# Altium footprint library iMag.PcbLib: 77 footprints (part 4 of 5)
Each footprint in its own frame and in the unit in brackets; x right, y up, seen from the top. Pads: shape width x height; smd on the part's side, far side on the other; paste and mask are expansions set on the pad; w line width, h text height; cw(c..) or ccw(c..) is an arc to the next point about the centre after c.
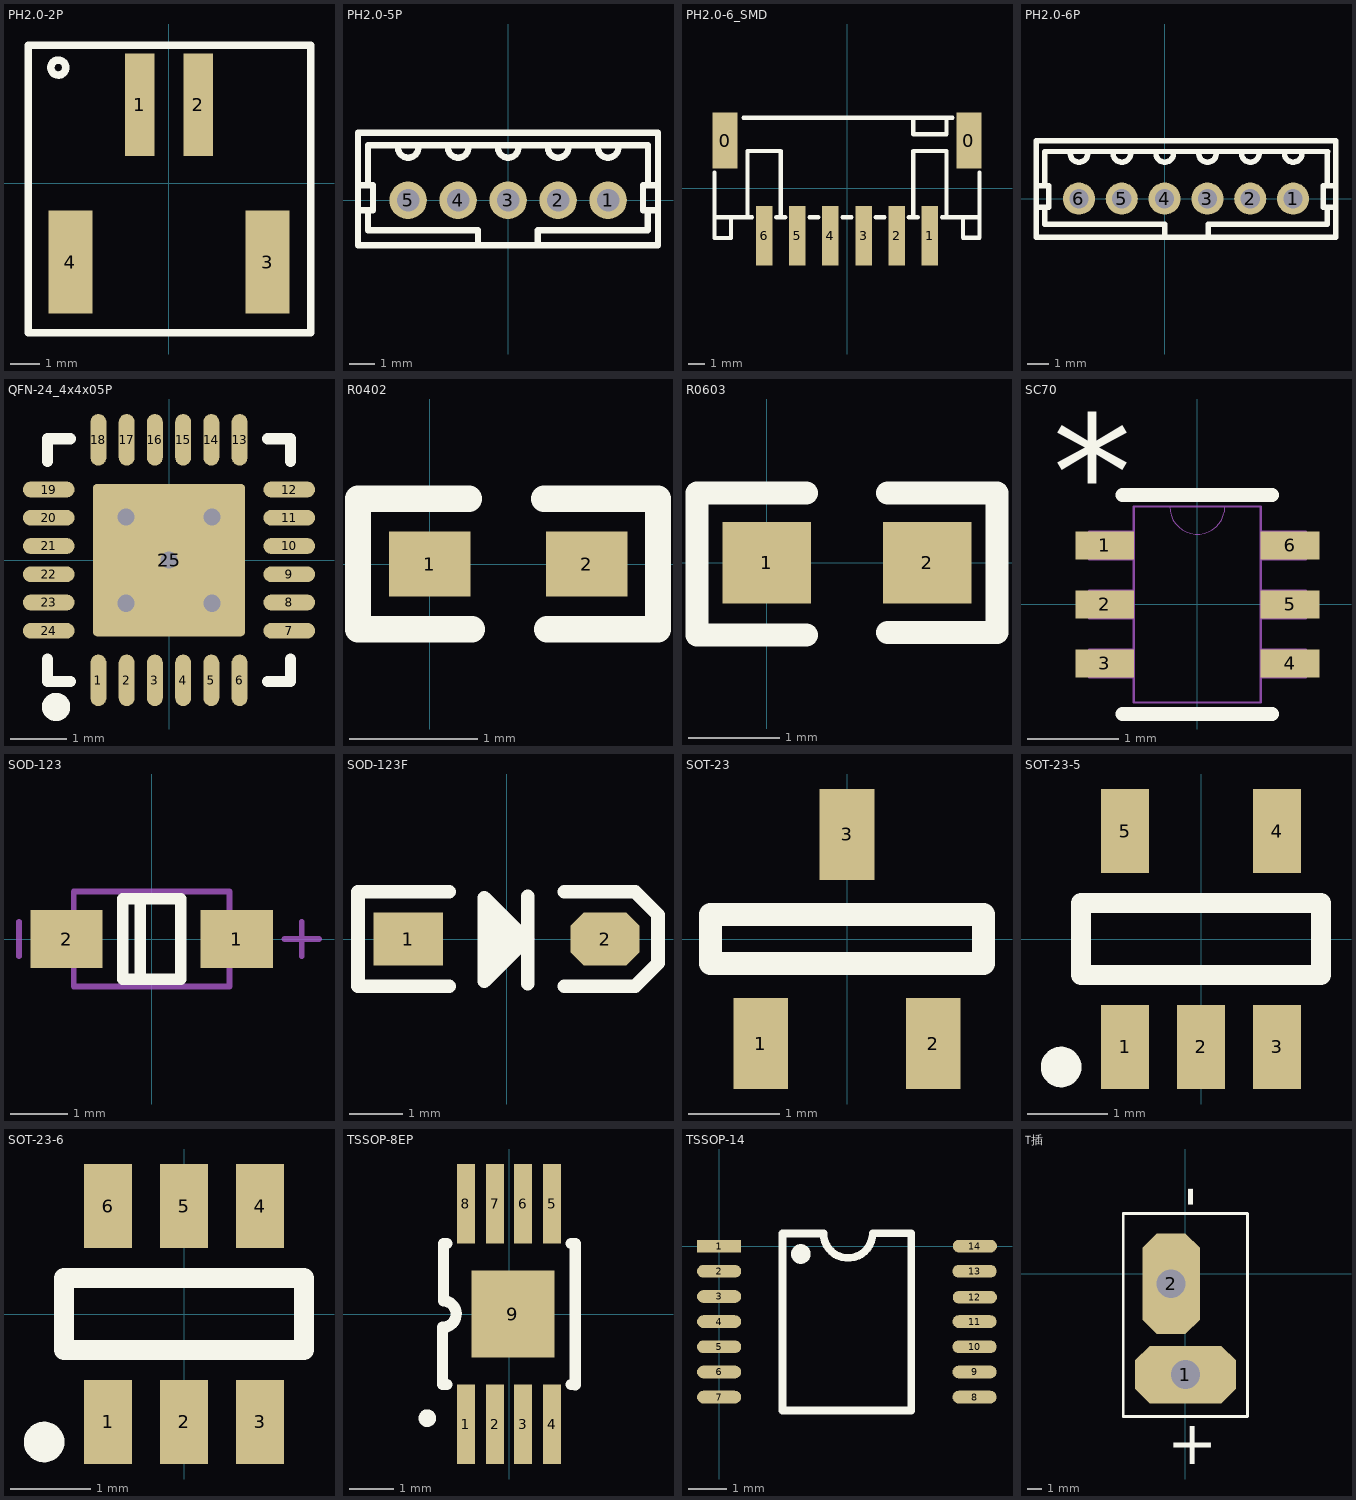
[diagram p3: the footprints below, top view; thin cyan lines are the x and y axes]

## PH2.0-2P [mm] "CONN-SMD_2P-P2.00_A2001WR-S-2P"
height 10.16
pads (4):
  rect 1x3.5 smd: 1(-1,2.675) 2(1,2.675)
  rect 1.5x3.5 smd: 3(3.35,-2.675) 4(-3.35,-2.675)
Top Overlay:
  circle w0.254: c-3.764,3.937 r0.254
  lines w0.254: -4.78,-5.08 4.826,-5.08 4.826,4.699 -4.78,4.699 -4.78,-5.08
3D body "User Library-PH2_0-2P.X_T": height 6.76, standoff 0.06, extent -3,-3.556 3,4.394

## PH2.0-5P [mm]
pads (5):
  round 1.5 hole 0.9: 1(4,0) 2(2,0) 3(0,0) 4(-2,0) 5(-4,0)
Top Overlay:
  lines w0.254: -6.002,-0.399 -5.402,-0.399 -5.402,0.601 -6.002,0.601 ; -5.601,-0.398 -5.601,-1.198 -1.201,-1.198 -1.201,-1.798 ; -5.6,0.6 -5.601,0.599 -5.601,2.202 5.598,2.202 5.598,0.602 ; -4.394,2.203 ccw(c-3.994,2.113) -3.594,2.203 ; -2.393,2.203 ccw(c-1.993,2.113) -1.593,2.203 ; -0.393,2.203 ccw(c0.007,2.113) 0.407,2.203 ; 1.196,-1.796 1.196,-1.196 5.596,-1.196 5.596,-0.396 ; 1.605,2.203 ccw(c2.005,2.113) 2.405,2.203 ; 3.605,2.203 ccw(c4.005,2.113) 4.405,2.203 ; 5.998,-1.798 5.998,2.702 ; 5.998,-0.398 5.398,-0.398 5.398,0.602 5.998,0.602 ; 6,-1.799 -6,-1.799 -6,2.702 6,2.702
3D body "User Library-PH2_0-5P.X_T": height 6, standoff -3.44, extent -6,-1.651 6,3.149

## PH2.0-6_SMD [mm]
pads (8):
  rect 1.5x3.4 smd: 0(-7.35,2.875) 0(7.35,2.875)
  rect 1x3.6 smd: 1(5,-2.875) 2(3,-2.875) 3(1,-2.875) 4(-1,-2.875) 5(-3.001,-2.871) 6(-5,-2.874)
Top Overlay:
  lines w0.254: -8.001,-1.75 -8.001,0.944 ; -7,-1.75 -7,-3 -8,-3 -8,-1.75 -5.731,-1.75 ; -6.25,4.25 6.369,4.25 ; -6,-1.75 -6,2.25 -4,2.25 -4,-1.75 ; -4.269,-1.75 -3.732,-1.75 ; -2.27,-1.75 -1.731,-1.75 ; -0.269,-1.75 0.269,-1.75 ; 1.731,-1.75 2.269,-1.75 ; 3.731,-1.75 4.269,-1.75 ; 4,-1.75 4,2.25 6,2.25 6,-1.75 ; 4,4.25 4,3.25 6,3.25 6,4.25 ; 5.731,-1.75 7.999,-1.75 ; 6.999,-1.747 6.999,-2.998 7.999,-2.998 7.999,-1.747 7.999,0.944

## PH2.0-6P [mm]
pads (6):
  round 1.5 hole 0.9: 1(6,0) 2(4,0) 3(2,0) 4(0,0) 5(-2,0) 6(-4,0)
Top Overlay:
  lines w0.254: -6.002,-0.399 -5.402,-0.399 -5.402,0.601 -6.002,0.601 ; -5.601,-0.398 -5.601,-1.198 0,-1.198 0,-1.798 ; -5.6,0.6 -5.601,0.599 -5.601,2.202 7.62,2.202 ; -4.394,2.203 ccw(c-3.994,2.113) -3.594,2.203 ; -2.393,2.203 ccw(c-1.993,2.113) -1.593,2.203 ; -0.393,2.203 ccw(c0.007,2.113) 0.407,2.203 ; 1.605,2.203 ccw(c2.005,2.113) 2.405,2.203 ; 2.032,-1.796 2.032,-1.196 5.596,-1.196 7.598,-1.196 ; 3.605,2.203 ccw(c4.005,2.113) 4.405,2.203 ; 5.605,2.203 ccw(c6.005,2.113) 6.405,2.203 ; 7.601,-1.198 7.601,-0.398 ; 7.601,0.599 7.601,2.202 ; 8,-1.798 8,2.702 6,2.702 -6,2.702 -6,-1.798 8.001,-1.799 ; 8.002,-0.399 7.402,-0.399 7.402,0.601 8.002,0.601
3D body "User Library-PH2_0-6P-1.X_T": height 4.8, standoff -3.15, extent -5.984,-6.477 8.016,0.223

## QFN-24_4x4x05P [mm]
height 1
pads (25):
  oval 0.28x0.914 smd mask+0.051: 1(-1.25,-2.13) 2(-0.75,-2.13) 3(-0.25,-2.13) 4(0.25,-2.13) 5(0.75,-2.13) 6(1.25,-2.13) 13(1.25,2.13) 14(0.75,2.13) 15(0.25,2.13) 16(-0.25,2.13) 17(-0.75,2.13) 18(-1.25,2.13)
  oval 0.914x0.28 smd mask+0.051: 7(2.13,-1.25) 8(2.13,-0.75) 9(2.13,-0.25) 10(2.13,0.25) 11(2.13,0.75) 12(2.13,1.25) 19(-2.13,1.25) 20(-2.13,0.75) 21(-2.13,0.25) 22(-2.13,-0.25) 23(-2.13,-0.75) 24(-2.13,-1.25)
  rrect6% 2.7x2.7 smd mask+0.051: 25(0,0)
via -0.762,0.762 diameter 0.635 hole 0.305
via -0.762,-0.762 diameter 0.635 hole 0.305
via 0.762,-0.762 diameter 0.635 hole 0.305
via 0.762,0.762 diameter 0.635 hole 0.305
via 0,0 diameter 0.635 hole 0.305
Top Overlay:
  circle w0.25: c-2,-2.6 r0.125
  lines w0.2: -2.15,-1.75 -2.15,-2.15 -1.75,-2.15 ; -2.15,1.75 -2.15,2.15 -1.75,2.15 ; 1.75,-2.15 2.15,-2.15 2.15,-1.75 ; 1.75,2.15 2.15,2.15 2.15,1.75
3D body: height 0.9, standoff 0.01, extent -2,-2 2,2

## R0402 [mil] "1/16W"
pads (2):
  rect 25x20 smd: 1(0,0) 2(48.2,0)
Top Overlay:
  lines w8: 12,20 -22,20 -22,-20 13,-20 ; 35,20 70,20 70,-20 36,-20
3D body "R0402.STEP": height 13.78, standoff 0, extent 4.71,-9.79 44.09,9.9

## R0603 [mil] "1/10W"
pads (2):
  rect 38x35 smd: 1(0,0) 2(69,0)
Top Overlay:
  lines w10: 17,-31 -30,-31 -30,30 17,30 ; 52,-30 99,-30 99,30 52,30
3D body "R0603.STEP": height 17.72, standoff 0, extent 3.51,-15.74 66.5,15.75

## SC70 [mil]
pads (6):
  rect 25.41x12 smd paste+0 mask+0: 1(-40.2,25.59) 2(-40.2,0) 3(-40.2,-25.59) 4(40.2,-25.59) 5(40.2,0) 6(40.2,25.59)
Top Overlay:
  lines w6: -32.5,-47.5 32.5,-47.5 ; -32.5,47.5 32.5,47.5
  text "*" at -62.7,32.59 h50
Mechanical 13:
  lines w0: -12,42.5 ccw(c0,42.5) 12,42.5
  lines w1: -47,-31.59 -47,-19.59 -27.5,-19.59 -27.5,-31.59 -47,-31.59 ; -47,-6 -47,6 -27.5,6 -27.5,-6 -47,-6 ; -47,19.59 -47,31.59 -27.5,31.59 -27.5,19.59 -47,19.59 ; -27.5,-42.5 27.5,-42.5 27.5,42.5 -27.5,42.5 -27.5,-42.5 ; 27.5,-31.59 27.5,-19.59 47,-19.59 47,-31.59 27.5,-31.59 ; 27.5,-6 27.5,6 47,6 47,-6 27.5,-6 ; 27.5,19.59 27.5,31.59 47,31.59 47,19.59 27.5,19.59
  text "*" at -25,-10.5 h50
3D body "User Library-SC70-6-1.step": height 37.4, standoff 0, extent -41.34,-40 41.34,38.74

## SOD-123 [mm]
height 1.1
pads (2):
  rect 1.25x1 smd: 1(1.475,0) 2(-1.475,0)
Top Overlay:
  lines w0.2: -0.2,-0.7 -0.2,0.7 ; -0.5,-0.7 -0.5,0.7 0.5,0.7 0.5,-0.7 -0.5,-0.7
Mechanical 13:
  lines w0.1: -1.35,-0.825 1.35,-0.825 1.35,0.825 -1.35,0.825 -1.35,-0.825
Mechanical 15:
  lines w0.1: -2.3,-0.3 -2.3,0.3 ; 2.3,0 2.9,0 ; 2.6,-0.3 2.6,0.3
3D body "SOD123.STEP": height 1.35, standoff 0, extent -1.85,-0.775 1.85,0.775

## SOD-123F [mm] "2.7x1.6X1.1mm（长宽高，不包括引脚）"
pads (2):
  rect 1.3x1 smd: 1(-1.85,0)
  oct 1.3x1 smd: 2(1.85,0)
Top Overlay:
  lines w0.254: -1.079,-0.889 -2.794,-0.889 -2.794,0.889 -1.079,0.889 ; -0.254,0.559 -0.229,-0.432 0.254,0 0,0.254 0,0 0,-0.254 ; 0.356,-0.02 -0.417,-0.792 -0.417,0.775 0.396,-0.038 ; 0.396,-0.841 0.396,0.805 ; 1.079,-0.889 2.413,-0.889 2.845,-0.457 2.845,0.457 2.413,0.889 1.079,0.889
Mechanical 15:
  circle w0.05: c0,0 r0.35
  lines w0.05: -0.5,0 0.5,0 ; 0,-0.5 0,0.5
3D body "SOD-123F.STEP": height 1.15, standoff 0.04, extent -1.9,-0.8 1.9,0.8

## SOT-23 [mm] "SOT-23-3"
height 1.1
pads (3):
  rect 0.6x1 smd: 1(-0.95,-1.15) 2(0.95,-1.15) 3(0,1.15)
Top Overlay:
  lines w0.254: -1.5,-0.27 -1.5,0.27 1.5,0.27 1.5,-0.27 -1.5,-0.27
3D body "SOT-23-3.STEP": height 0.99, standoff 0.01, extent -1.46,-1.275 1.46,1.273

## SOT-23-5 [mm] "SOT-23-5"
height 1.2
pads (5):
  rect 0.6x1.05 smd: 1(-0.95,-1.35) 2(0,-1.35) 3(0.95,-1.35) 4(0.95,1.35) 5(-0.95,1.35)
Top Overlay:
  circle w0.254: c-1.75,-1.6 r0.127
  lines w0.254: -1.5,-0.45 1.5,-0.45 1.5,0.45 -1.5,0.45 -1.5,-0.45
3D body "SOT-23-5.STEP": height 1.3, standoff 0, extent -1.5,-1.5 1.5,1.5

## SOT-23-6 [mm] "SOT-23-6"
height 1.2
pads (6):
  rect 0.6x1.05 smd: 1(-0.95,-1.35) 2(0,-1.35) 3(0.95,-1.35) 4(0.95,1.35) 5(0,1.35) 6(-0.95,1.35)
Top Overlay:
  circle w0.254: c-1.75,-1.6 r0.127
  lines w0.254: -1.5,-0.45 1.5,-0.45 1.5,0.45 -1.5,0.45 -1.5,-0.45
3D body "SOT-23-6.STEP": height 1.3, standoff 0, extent -1.5,-1.5 1.5,1.5

## TSSOP-8EP [mil] "TSSOP-8_L3.0-W3.0-P0.65-LS4.9-BL-EP"
pads (9):
  rect 16x71 smd: 1(-38.5,-98.42) 2(-12.5,-98.42) 3(12.5,-98.42) 4(38.5,-98.42) 5(38.5,98.42) 6(12.5,98.42) 7(-12.5,98.42) 8(-38.5,98.42)
  rect 74.02x77.96 smd: 9(3.5,-0.03)
Top Overlay:
  circle w10: c-73,-93 r2.83
  lines w10: -55.6,-63 -59.5,-63 -59.5,-11.81 ccw(c-59,0.01) -58.5,11.81 -58.5,62.96 -55.6,62.96 ; 55.6,-63 59.1,-63 ; 55.6,62.96 59.1,62.96 ; 59.1,-63.1 59.1,62.8
3D body "PW8-M.step": height 47.09, standoff 0, extent -60.98,-129.99 60.99,130.01

## TSSOP-14 [mm] "4.96x4.40x1.00 e=0.65（蒜米工坊）"
pads (14):
  rect 1.143x0.33 smd: 1(0,0)
  oval 1.143x0.33 smd: 2(0,-0.65) 3(0,-1.3) 4(0,-1.95) 5(0,-2.6) 6(0,-3.25) 7(0,-3.9) 8(6.6,-3.9) 9(6.6,-3.25) 10(6.6,-2.6) 11(6.6,-1.95) 12(6.608,-1.321) 13(6.6,-0.65) 14(6.608,0)
Top Overlay:
  circle w0.254: c2.112,-0.203 r0.127
  lines w0.2: 2.687,0.325 1.635,0.325 1.635,-4.249 4.965,-4.249 4.965,0.325 ; 2.696,0.33 ccw(c3.331,0.33) 3.966,0.33 4.96,0.33
3D body "TSSOP14.STEP": height 1.03, standoff -0.02, extent 0.028,-4.43 6.432,0.57

## T插 [mm]
pads (2):
  oct 7x4 hole 2 square: 1(0,-7)
  oct 4x7 hole 2 square: 2(-1,-0.692)
Top Overlay:
  lines w0.2: -4.318,-9.906 -4.318,4.191 4.318,4.191 4.318,-2.233 4.318,-8.217 4.318,-9.906 -4.318,-9.906
  text "-" at 1.524,4.572 h3.05
  text "+" at -1.27,-13.208 h3.05
3D body "User Library-T_Port.step": height 13, standoff -5, extent -4.308,-10.206 3.292,3.094